# Altium footprint library Ultrascale_PcbLib.PcbLib: 132 footprints (part 9 of 9)
Each footprint in its own frame and in the unit in brackets; x right, y up, seen from the top. Pads: shape width x height; smd on the part's side, far side on the other; paste and mask are expansions set on the pad; w line width, h text height; cw(c..) or ccw(c..) is an arc to the next point about the centre after c.
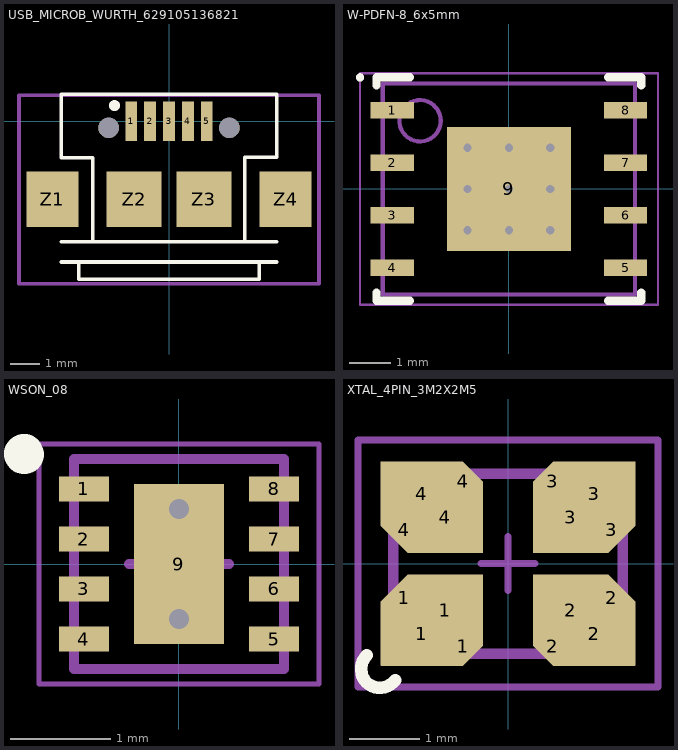
[diagram p8: the footprints below, top view; thin cyan lines are the x and y axes]

## USB_MICROB_WURTH_629105136821 [mm] "5 pins"
height 3
pads (11):
  rect 0.4x1.35 smd mask+0.05: 1(-1.3,0) 2(-0.65,0) 3(0,0) 4(0.65,0) 5(1.3,0)
  rect 1.8x1.9 smd mask+0.05: Z1(-4,-2.675) Z4(4,-2.675)
  rect 1.9x1.9 smd mask+0.05: Z2(-1.2,-2.675) Z3(1.2,-2.675)
  round 0.7 hole 0.7 unplated mask+0.05: ""(-2.075,-0.225) ""(2.075,-0.225)
Top Overlay:
  circle w0.254: c-1.87,0.54 r0.06
  lines w0.12: -3.7,0.925 -3.7,-1.25 -2.625,-1.25 -2.625,-4.137 ; 2.6,-4.137 2.6,-1.225 3.7,-1.225 3.7,0.925
  lines w0.127: -3.7,-4.827 3.7,-4.827 ; -3.7,-4.137 3.7,-4.137 ; -3.7,0.925 3.7,0.925 ; -3.1,-4.827 -3.1,-5.425 3.1,-5.425 3.1,-4.827
Mechanical 15:
  lines w0.127: -5.15,-5.571 5.15,-5.571 5.15,0.9 -5.15,0.9 -5.15,-5.571
3D body "629105136821.stp": height 2.69, standoff -0.61, extent -4,-5.431 4,0.473

## W-PDFN-8_6x5mm [mm] "SON, 8-Leads, Body 5.00x6.00mm, Pitch 1.27mm, Thermal Pad 3.00x3.00mm, IPC Medium Density"
height 0.8
pads (9):
  rect 1.05x0.4 smd: 1(-2.82,1.905) 2(-2.82,0.635) 3(-2.82,-0.635) 4(-2.82,-1.905) 5(2.82,-1.905) 6(2.82,-0.635) 7(2.82,0.635) 8(2.82,1.905)
  rect 3x3 smd paste-1.5: 9(0,0)
via 1,-1 diameter 0.5 hole 0.2
via 0,-1 diameter 0.5 hole 0.2
via -1,-1 diameter 0.5 hole 0.2
via 1,0 diameter 0.5 hole 0.2
via 0,0 diameter 0.5 hole 0.2
via -1,0 diameter 0.5 hole 0.2
via 1,1 diameter 0.5 hole 0.2
via 0,1 diameter 0.5 hole 0.2
via -1,1 diameter 0.5 hole 0.2
Top Overlay:
  circle w0.1: c-3.6,2.7 r0.05
  lines w0.2: -3.2,-2.505 -3.2,-2.7 -2.395,-2.7 ; -3.2,2.505 -3.2,2.7 -2.395,2.7 ; 2.395,-2.7 3.2,-2.7 3.2,-2.505 ; 2.395,2.7 3.2,2.7 3.2,2.505
Top Paste:
  rectangle: 0.1,-1.4 1.4,-0.1
  rectangle: 0.1,0.1 1.4,1.4
  rectangle: -1.4,-1.4 -0.1,-0.1
  rectangle: -1.4,0.1 -0.1,1.4
Mechanical 13:
  circle w0.1: c-2.15,1.65 r0.5
  lines w0.1: -3.05,-2.55 3.05,-2.55 3.05,2.55 -3.05,2.55 -3.05,-2.55
Mechanical 15:
  lines w0.05: -3.605,-2.8 3.605,-2.8 3.605,2.8 -3.605,2.8 -3.605,-2.8
  lines w0.1: -0.5,0 0.5,0 ; 0,-0.5 0,0.5
3D body "SON127P600X80_HS-9N_2.step": height 0.8, standoff 0, extent -3.05,-2.55 3.05,2.55

## WSON_08 [mm] "TI WSON 0.8 Package  2mmx2mm"
height 0.8
pads (9):
  rect 0.5x0.25 smd paste+0 mask+0.05: 1(-0.95,0.75) 2(-0.95,0.25) 3(-0.95,-0.25) 4(-0.95,-0.75) 5(0.95,-0.75) 6(0.95,-0.25) 7(0.95,0.25) 8(0.95,0.75)
  rect 0.9x1.6 smd paste-5 mask+0.05: 9(0,0)
via 0,0.55 diameter 0.5 hole 0.2
via 0,-0.55 diameter 0.5 hole 0.2
Top Overlay:
  lines w0.3: -1.515,1.135 ccw(c-1.55,1.1) -1.5,1.1
Top Paste:
  rectangle: -0.45,-0.8 0.45,-0.1
  rectangle: -0.45,0.1 0.45,0.8
Mechanical 13:
  lines w0.1: -1.05,-1.05 -1.05,1.05 1.05,1.05 1.05,-1.05 -1.05,-1.05
Mechanical 15:
  lines w0.05: -1.4,-1.2 -1.4,1.2 1.4,1.2 1.4,-1.2 -1.4,-1.2
  lines w0.1: -0.5,0 0.5,0 ; 0,-0.5 0,0.5
3D body: height 0.8, standoff 0, extent -1.05,-1.05 1.05,1.05
3D body: height 0.81, standoff 0.8, extent -0.8,0.5 -0.5,0.8

## XTAL_4PIN_3M2X2M5 [mil] "Crystal 4 pin 3.2 x 2.5 mm"
height 39.37
pads (16):
  rrect1% 21.07x15.44 smd rot 45: 1(-58,-19) 3(58,19)
  rrect1% 46x36 smd: 1(-48,-39) 2(48,-39) 3(48,39) 4(-48,39)
  rrect1% 42x40 smd: 1(-35,-26) 2(35,-26) 3(35,26) 4(-35,26)
  rrect1% 15.44x15.44 smd rot 45: 1(-25,-46) 2(25,-46) 3(25,46) 4(-25,46)
  rrect1% 21.07x15.44 smd rot 135: 2(58,-19) 4(-58,19)
Top Overlay:
  lines w7: -78.74,-51.18 ccw(c-71.47,-58.76) -62.99,-64.96
Mechanical 11:
  lines w3.94: -64.96,-51.18 64.96,-51.18 64.96,51.18 -64.96,51.18 -64.96,-51.18
Mechanical 13:
  lines w3.94: -62.99,-49.21 62.99,-49.21 62.99,49.21 -62.99,49.21 -62.99,-49.21
Mechanical 15:
  lines w3.94: -15,0 15,0 ; 0,-15 0,15 ; -83.66,-68.9 -83.66,68.9 83.66,68.9 83.66,-68.9 -83.66,-68.9
3D body "XTAL-3_2x2_5.STEP": height 35.83, standoff -0.39, extent -62.99,-49.21 63,49.22